# Altium footprint library 逸芬的库鸭.PcbLib: 255 footprints (part 4 of 20)
Each footprint in its own frame and in the unit in brackets; x right, y up, seen from the top. Pads: shape width x height; smd on the part's side, far side on the other; paste and mask are expansions set on the pad; w line width, h text height; cw(c..) or ccw(c..) is an arc to the next point about the centre after c.
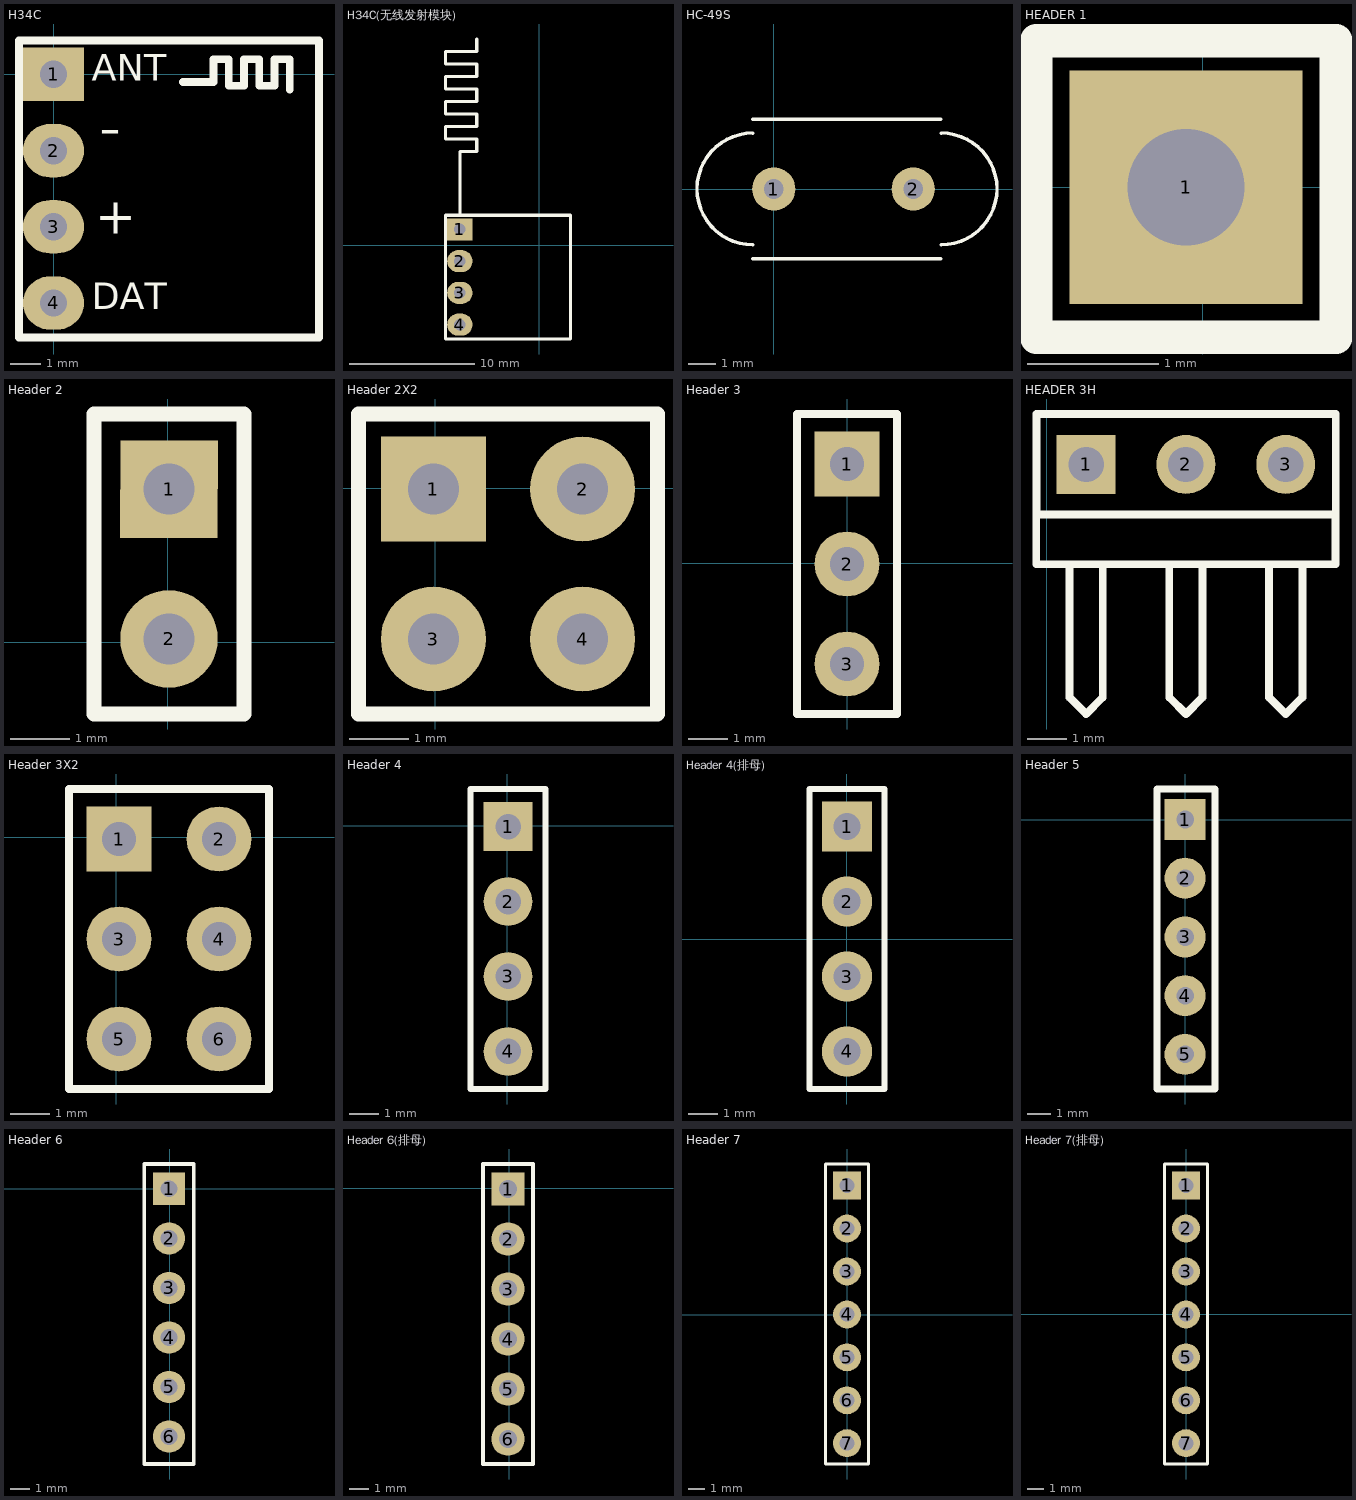
[diagram p3: the footprints below, top view; thin cyan lines are the x and y axes]

## H34C [mil]
pads (4):
  rect 80x70 hole 36: 1(0,0)
  oval 80x70 hole 36: 2(0,-100) 3(0,-200) 4(0,-300)
Top Overlay:
  lines w10: 170,-10 210,-10 210,20 230,20 230,-15 250,-15 250,20 270,20 270,-15 290,-15 290,20 310,20 310,-10 310,-20 ; -45.28,-345.28 348.43,-345.28 348.43,44.49 84.65,44.49 -45.28,44.49 -45.28,-345.28
  text "ANT" at 50,-20 h60
  text "-" at 60,-115 h100
  text "+" at 55,-225 h80
  text "DAT" at 50,-320 h60
3D body "HDR1X4_2.54mm.STEP": height 336.22, standoff -118.11, extent -50,-350 50,50
3D body: height 40, standoff 30, extent 175,-300 275,0
3D body: height 30, standoff 0, extent -40,-340 345,40

## H34C(无线发射模块) [mil]
pads (4):
  rect 80x70 hole 36: 1(-250,50)
  oval 80x70 hole 36: 2(-250,-50) 3(-250,-150) 4(-250,-250)
Top Overlay:
  lines w10: -250,94.49 -250,295.28 -196.85,295.28 -196.85,334.65 -295.28,334.65 -295.28,374.02 -196.85,374.02 -196.85,413.39 -295.28,413.39 -295.28,452.76 -196.85,452.76 -196.85,492.13 -295.28,492.13 -295.28,531.5 -196.85,531.5 -196.85,570.87 -295.28,570.87 -295.28,610.24 -196.85,610.24 -196.85,649.61 ; -295.28,-295.28 -295.28,94.49 -165.35,94.49 98.43,94.49 98.43,-295.28 -295.28,-295.28

## HC-49S [mil]
pads (2):
  round 62 hole 28: 1(0,0) 2(200,0)
Top Overlay:
  lines w5: -30,-100.31 239.69,-100.31 ; -30,-80 cw(c-30,0.16) -30,80.31 ; -30,100.31 239.69,100.31 ; 240,-80 ccw(c240,0.16) 240,80.31
3D body "XTAL.STEP": height 142.73, standoff -77.74, extent -113.55,-101.53 326.32,82.43

## HEADER 1 [mil]
pads (1):
  rect 70x70 hole 35: 1(-5,0)
Top Overlay:
  lines w10: -50,-45 40,-45 40,44 12,44 -22,44 -50,44 -50,-45

## Header 2 [mil]
pads (2):
  rect 65x65 hole 34: 1(0.81,102.01)
  round 65 hole 34: 2(0.81,2.01)
Top Overlay:
  lines w10: -49.19,-47.99 50.81,-47.99 50.81,152.01 -49.19,152.01 -49.19,-47.99
3D body "User Library-CONMHS2A-2mm54.STEP": height 314.96, standoff -118.11, extent -46,-49.99 54,150.01

## Header 2X2 [mil]
pads (4):
  rect 70x70 hole 34: 1(-1.16,-0.35)
  round 70 hole 34: 2(98.25,-0.35) 3(-1.16,-100.35) 4(98.25,-100.35)
Top Overlay:
  lines w10: 48.25,-150.35 148.25,-150.35 148.25,49.65 48.25,49.65 ; 48.84,-150.35 -51.16,-150.35 -51.16,49.65 48.84,49.65
3D body "User Library-CONMHS2A-2mm54.STEP": height 314.96, standoff -118.11, extent -47.97,-152.35 52.03,47.65
3D body "User Library-CONMHS2A-2mm54.STEP": height 314.96, standoff -118.11, extent 51.44,-152.35 151.44,47.65

## Header 3 [mil]
pads (3):
  rect 65x65 hole 34: 1(0,99)
  round 65 hole 34: 2(0,-1) 3(0,-101)
Top Overlay:
  lines w7.87: -50,-151 50,-151 50,149 -50,149 -50,-151
3D body "HDR1X3_2.54mm.STEP": height 336.22, standoff -118.11, extent -50,-151 50,149

## HEADER 3H [mm]
pads (3):
  rect 1.5x1.5 hole 0.9: 1(1.007,-2.396)
  round 1.5 hole 0.9: 2(3.547,-2.396) 3(6.087,-2.396)
Top Overlay:
  lines w0.2: -0.258,-3.652 -0.258,-1.112 7.362,-1.112 7.362,-3.652 ; 0.584,-4.936 0.584,-8.323 1.007,-8.746 1.431,-8.323 1.431,-4.936 ; 3.124,-4.936 3.124,-8.323 3.547,-8.746 3.971,-8.323 3.971,-4.936 ; 5.664,-4.936 5.664,-8.323 6.087,-8.746 6.511,-8.323 6.511,-4.936 ; -0.263,-4.936 7.357,-4.936 7.357,-3.666 -0.263,-3.666 -0.263,-4.936
3D body "hdr3.stp": height 2.54, standoff -1, extent -0.263,-12.365 7.357,-2.015

## Header 3X2 [mil]
pads (6):
  rect 65x65 hole 34: 1(2.94,-1.52)
  round 65 hole 34: 2(102.94,-1.52) 3(2.94,-101.52) 4(102.94,-101.52) 5(2.94,-201.52) 6(102.94,-201.52)
Top Overlay:
  lines w7.87: -47.06,-59.86 -47.06,-251.52 ; -47.06,-251.52 152.94,-251.52 152.94,48.48 -47.06,48.48 -47.06,-251.52
3D body "61300621121.stp": height 338.19, standoff -116.14, extent -45.52,-254 154.48,46

## Header 4 [mil]
pads (4):
  rect 65x65 hole 34: 1(0.95,-0.93)
  round 65 hole 34: 2(0.95,-100.93) 3(0.95,-200.93) 4(0.95,-300.93)
Top Overlay:
  lines w7.87: -49.05,-350.93 -49.05,49.07 50.95,49.07 50.95,-350.93 -49.05,-350.93
3D body "HDR1X4_2.54mm.STEP": height 336.22, standoff -118.11, extent -51.18,-353.54 48.82,46.46

## Header 4(排母) [mm]
pads (4):
  rect 1.7x1.7 hole 0.9: 1(0.015,3.826)
  round 1.7 hole 0.9: 2(0.015,1.286) 3(0.015,-1.254) 4(0.015,-3.794)
Top Overlay:
  lines w0.2: -1.255,-5.064 1.285,-5.064 1.285,5.096 -1.255,5.096 -1.255,-5.064
3D body "HDR2.54-1P_M.STEP": height 8.5, standoff -3, extent -1.255,-2.524 1.285,0.016
3D body "HDR2.54-1P_M.STEP": height 8.5, standoff -3, extent -1.255,-5.064 1.285,-2.524
3D body "HDR2.54-1P_M.STEP": height 8.5, standoff -3, extent -1.255,2.556 1.285,5.096
3D body "HDR2.54-1P_M.STEP": height 8.5, standoff -3, extent -1.255,0.016 1.285,2.556

## Header 5 [mil]
pads (5):
  rect 70x70 hole 30: 1(0,0)
  round 70 hole 30: 2(0,-100) 3(0,-200) 4(0,-300) 5(0,-400)
Top Overlay:
  lines w12: -48,-459 -48,52 51,52 51,-459 -48,-459
3D body "User Library-CONMHS2A-2mm54.STEP": height 314.96, standoff -118.11, extent -46.81,-452 53.19,-252
3D body "HDR1X3_2.54mm.STEP": height 336.22, standoff -118.11, extent -50,-250 50,50

## Header 6 [mil]
pads (6):
  rect 65x65 hole 34: 1(-1.02,0.06)
  round 65 hole 34: 2(-1.02,-99.94) 3(-1.02,-199.94) 4(-1.02,-299.94) 5(-1.02,-399.75) 6(-1.02,-499.75)
Top Overlay:
  lines w7.87: -51.02,-555.12 -51.02,50.06 48.98,50.06 48.98,-555.12 -51.02,-555.12
3D body "HDR1X6_2.54mm.STEP": height 336.22, standoff -118.11, extent -50,-553.74 50,46.26

## Header 6(排母) [mm]
pads (6):
  rect 1.7x1.7 hole 0.9: 1(-0.06,-0.04)
  round 1.7 hole 0.9: 2(-0.06,-2.58) 3(-0.06,-5.12) 4(-0.06,-7.66) 5(-0.06,-10.2) 6(-0.06,-12.74)
Top Overlay:
  lines w0.2: -1.33,-14.01 1.21,-14.01 1.21,1.23 -1.33,1.23 -1.33,-14.01
3D body "HDR2.54-1P_M.STEP": height 8.5, standoff -3, extent -1.33,-6.39 1.21,-3.85
3D body "HDR2.54-1P_M.STEP": height 8.5, standoff -3, extent -1.33,-1.31 1.21,1.23
3D body "HDR2.54-1P_M.STEP": height 8.5, standoff -3, extent -1.33,-3.85 1.21,-1.31
3D body "HDR2.54-1P_M.STEP": height 8.5, standoff -3, extent -1.33,-14.01 1.21,-11.47
3D body "HDR2.54-1P_M.STEP": height 8.5, standoff -3, extent -1.33,-8.93 1.21,-6.39
3D body "HDR2.54-1P_M.STEP": height 8.5, standoff -3, extent -1.33,-11.47 1.21,-8.93

## Header 7 [mil]
pads (7):
  rect 65x65 hole 34: 1(0,301)
  round 65 hole 34: 2(0,201) 3(0,101) 4(0,1) 5(0,-98.8) 6(0,-198.8)
  round 65 hole 34 paste+0: 7(0,-298.61)
Top Overlay:
  lines w7.87: -50,-347 -50,351 50,351 50,-347 -49,-347
3D body: height 336.22, standoff -118.11, extent -50,-348.61 50,351.39

## Header 7(排母) [mil]
pads (7):
  rect 65x65 hole 34: 1(0,300)
  round 65 hole 34: 2(0,200) 3(0,100) 4(0,0) 5(0,-99.8) 6(0,-199.8)
  round 65 hole 34 paste+0: 7(0,-299.61)
Top Overlay:
  lines w7.87: -50,-348 -50,350 50,350 50,-348 -49,-348
3D body "HDR2.54-1P_M.STEP": height 334.65, standoff -118.11, extent -50,250 50,350
3D body "HDR2.54-1P_M.STEP": height 334.65, standoff -118.11, extent -50,150 50,250
3D body "HDR2.54-1P_M.STEP": height 334.65, standoff -118.11, extent -50,50 50,150
3D body "HDR2.54-1P_M.STEP": height 334.65, standoff -118.11, extent -50,-50 50,50
3D body "HDR2.54-1P_M.STEP": height 334.65, standoff -118.11, extent -50,-149.8 50,-49.8
3D body "HDR2.54-1P_M.STEP": height 334.65, standoff -118.11, extent -50,-249.8 50,-149.8
3D body "HDR2.54-1P_M.STEP": height 334.65, standoff -118.11, extent -50,-349.61 50,-249.61